# Altium schematic symbol library jlcpcb_2025_04_capacitors_extended_0402.schlib: 3594 symbols (part 16 of 20) (continued)
## GRM155R72A221KA01D
designator C?  Capacitance: 220pF  (hidden comment: *)
Capacitor, Ceramic (MLCC), 220pF, ±10%, 100V, X7R, ±10%, SMD 0402; Manufacturer: Murata Electronics; Manufacturer Part Number: GRM155R72A221KA01D; Package Size: 0402; JLCPCB Basic Part: No; JLCPCB Part Number: C117750; Supplier 1: LCSC; Category: Capacitors - MLCC; Supplier Part Number 1: C117750; Tolerance: ±10%; Voltage Rating: 100V; Temperature Coefficient: X7R; RoHS: Yes; ComponentLink1Description: Datasheet; ComponentLink1URL: https://wmsc.lcsc.com/wmsc/upload/file/pdf/v2/lcsc/2304140030_Murata-Electronics-GRM155R72A221KA01D_C117750.pdf; ComponentLink2Description: JLCPCB Part URL; ComponentLink2URL: https://jlcpcb.com/partdetail/C117750; ComponentLink3Description: LCSC Part URL; ComponentLink3URL: https://lcsc.com/product-detail/Multilayer-Ceramic-Capacitors-MLCC---SMD-SMT_Murata-Electronics-Murata-Electronics-GRM155R72A221KA01D_C117750.html
footprint CAP-0402 (0402 (1005M) Capacitor)
pins: 1, 2

## GRM155R72A332KA01D
designator C?  Capacitance: 3.3nF  (hidden comment: *)
Capacitor, Ceramic (MLCC), 3.3nF, ±10%, 100V, X7R, ±10%, SMD 0402; Manufacturer: Murata Electronics; Manufacturer Part Number: GRM155R72A332KA01D; Package Size: 0402; JLCPCB Basic Part: No; JLCPCB Part Number: C701289; Supplier 1: LCSC; Category: Capacitors - MLCC; Supplier Part Number 1: C701289; Tolerance: ±10%; Voltage Rating: 100V; Temperature Coefficient: X7R; RoHS: Yes; ComponentLink1Description: Datasheet; ComponentLink1URL: https://wmsc.lcsc.com/wmsc/upload/file/pdf/v2/lcsc/2304140030_Murata-Electronics-GRM155R72A332KA01D_C701289.pdf; ComponentLink2Description: JLCPCB Part URL; ComponentLink2URL: https://jlcpcb.com/partdetail/C701289; ComponentLink3Description: LCSC Part URL; ComponentLink3URL: https://lcsc.com/product-detail/Multilayer-Ceramic-Capacitors-MLCC---SMD-SMT_Murata-Electronics-Murata-Electronics-GRM155R72A332KA01D_C701289.html
footprint CAP-0402 (0402 (1005M) Capacitor)
pins: 1, 2

## GRM155R72A471KA01D
designator C?  Capacitance: 470pF  (hidden comment: *)
Capacitor, Ceramic (MLCC), 470pF, ±10%, 100V, X7R, ±10%, SMD 0402; Manufacturer: Murata Electronics; Manufacturer Part Number: GRM155R72A471KA01D; Package Size: 0402; JLCPCB Basic Part: No; JLCPCB Part Number: C437530; Supplier 1: LCSC; Category: Capacitors - MLCC; Supplier Part Number 1: C437530; Tolerance: ±10%; Voltage Rating: 100V; Temperature Coefficient: X7R; RoHS: Yes; ComponentLink1Description: Datasheet; ComponentLink1URL: https://wmsc.lcsc.com/wmsc/upload/file/pdf/v2/lcsc/2308111638_Murata-Electronics-GRM155R72A471KA01D_C437530.pdf; ComponentLink2Description: JLCPCB Part URL; ComponentLink2URL: https://jlcpcb.com/partdetail/C437530; ComponentLink3Description: LCSC Part URL; ComponentLink3URL: https://lcsc.com/product-detail/Multilayer-Ceramic-Capacitors-MLCC---SMD-SMT_Murata-Electronics-Murata-Electronics-GRM155R72A471KA01D_C437530.html
footprint CAP-0402 (0402 (1005M) Capacitor)
pins: 1, 2

## GRM155R72A472KA01D
designator C?  Capacitance: 4.7nF  (hidden comment: *)
Capacitor, Ceramic (MLCC), 4.7nF, ±10%, 100V, X7R, ±10%, SMD 0402; Manufacturer: Murata Electronics; Manufacturer Part Number: GRM155R72A472KA01D; Package Size: 0402; JLCPCB Basic Part: No; JLCPCB Part Number: C415704; Supplier 1: LCSC; Category: Capacitors - MLCC; Supplier Part Number 1: C415704; Tolerance: ±10%; Voltage Rating: 100V; Temperature Coefficient: X7R; RoHS: Yes; ComponentLink1Description: Datasheet; ComponentLink1URL: https://wmsc.lcsc.com/wmsc/upload/file/pdf/v2/lcsc/2304140030_Murata-Electronics-GRM155R72A472KA01D_C415704.pdf; ComponentLink2Description: JLCPCB Part URL; ComponentLink2URL: https://jlcpcb.com/partdetail/C415704; ComponentLink3Description: LCSC Part URL; ComponentLink3URL: https://lcsc.com/product-detail/Multilayer-Ceramic-Capacitors-MLCC---SMD-SMT_Murata-Electronics-Murata-Electronics-GRM155R72A472KA01D_C415704.html
footprint CAP-0402 (0402 (1005M) Capacitor)
pins: 1, 2

## GRM155R72A681KA01D
designator C?  Capacitance: 680pF  (hidden comment: *)
Capacitor, Ceramic (MLCC), 680pF, ±10%, 100V, X7R, ±10%, SMD 0402; Manufacturer: Murata Electronics; Manufacturer Part Number: GRM155R72A681KA01D; Package Size: 0402; JLCPCB Basic Part: No; JLCPCB Part Number: C464420; Supplier 1: LCSC; Category: Capacitors - MLCC; Supplier Part Number 1: C464420; Tolerance: ±10%; Voltage Rating: 100V; Temperature Coefficient: X7R; RoHS: Yes; ComponentLink1Description: Datasheet; ComponentLink1URL: https://wmsc.lcsc.com/wmsc/upload/file/pdf/v2/lcsc/2304140030_Murata-Electronics-GRM155R72A681KA01D_C464420.pdf; ComponentLink2Description: JLCPCB Part URL; ComponentLink2URL: https://jlcpcb.com/partdetail/C464420; ComponentLink3Description: LCSC Part URL; ComponentLink3URL: https://lcsc.com/product-detail/Multilayer-Ceramic-Capacitors-MLCC---SMD-SMT_Murata-Electronics-Murata-Electronics-GRM155R72A681KA01D_C464420.html
footprint CAP-0402 (0402 (1005M) Capacitor)
pins: 1, 2

## GRM155Z71A105KE01D
designator C?  Capacitance: 1uF  (hidden comment: *)
Capacitor, Ceramic (MLCC), 1uF, ±10%, 10V, X7R, ±10%, SMD 0402; Manufacturer: Murata Electronics; Manufacturer Part Number: GRM155Z71A105KE01D; Package Size: 0402; JLCPCB Basic Part: No; JLCPCB Part Number: C528974; Supplier 1: LCSC; Category: Capacitors - MLCC; Supplier Part Number 1: C528974; Tolerance: ±10%; Voltage Rating: 10V; Temperature Coefficient: X7R; RoHS: Yes; ComponentLink1Description: Datasheet; ComponentLink1URL: https://wmsc.lcsc.com/wmsc/upload/file/pdf/v2/lcsc/2005261833_Murata-Electronics-GRM155Z71A105KE01D_C528974.pdf; ComponentLink2Description: JLCPCB Part URL; ComponentLink2URL: https://jlcpcb.com/partdetail/C528974; ComponentLink3Description: LCSC Part URL; ComponentLink3URL: https://lcsc.com/product-detail/Multilayer-Ceramic-Capacitors-MLCC---SMD-SMT_Murata-Electronics-Murata-Electronics-GRM155Z71A105KE01D_C528974.html
footprint CAP-0402 (0402 (1005M) Capacitor)
pins: 1, 2

## GRM155Z71A225KE01D
designator C?  Capacitance: 2.2uF  (hidden comment: *)
Capacitor, Ceramic (MLCC), 2.2uF, 10V, X7R, SMD 0402; Manufacturer: Murata Electronics; Manufacturer Part Number: GRM155Z71A225KE01D; Package Size: 0402; JLCPCB Basic Part: No; JLCPCB Part Number: C2997286; Supplier 1: LCSC; Category: Capacitors - MLCC; Supplier Part Number 1: C2997286; Voltage Rating: 10V; Temperature Coefficient: X7R; RoHS: Yes; ComponentLink1Description: Datasheet; ComponentLink1URL: https://wmsc.lcsc.com/wmsc/upload/file/pdf/v2/lcsc/2208291730_Murata-Electronics-GRM155Z71A225KE01D_C2997286.pdf; ComponentLink2Description: JLCPCB Part URL; ComponentLink2URL: https://jlcpcb.com/partdetail/C2997286; ComponentLink3Description: LCSC Part URL; ComponentLink3URL: https://lcsc.com/product-detail/Multilayer-Ceramic-Capacitors-MLCC---SMD-SMT_Murata-Electronics-Murata-Electronics-GRM155Z71A225KE01D_C2997286.html
footprint CAP-0402 (0402 (1005M) Capacitor)
pins: 1, 2

## GRM155Z71A225KE44D
designator C?  Capacitance: 2.2uF  (hidden comment: *)
Capacitor, Ceramic (MLCC), 2.2uF, ±10%, 10V, X7R, ±10%, SMD 0402; Manufacturer: Murata Electronics; Manufacturer Part Number: GRM155Z71A225KE44D; Package Size: 0402; JLCPCB Basic Part: No; JLCPCB Part Number: C2999759; Supplier 1: LCSC; Category: Capacitors - MLCC; Supplier Part Number 1: C2999759; Tolerance: ±10%; Voltage Rating: 10V; Temperature Coefficient: X7R; RoHS: Yes; ComponentLink1Description: Datasheet; ComponentLink1URL: https://wmsc.lcsc.com/wmsc/upload/file/pdf/v2/lcsc/2208091530_Murata-Electronics-GRM155Z71A225KE44D_C2999759.pdf; ComponentLink2Description: JLCPCB Part URL; ComponentLink2URL: https://jlcpcb.com/partdetail/C2999759; ComponentLink3Description: LCSC Part URL; ComponentLink3URL: https://lcsc.com/product-detail/Multilayer-Ceramic-Capacitors-MLCC---SMD-SMT_Murata-Electronics-Murata-Electronics-GRM155Z71A225KE44D_C2999759.html
footprint CAP-0402 (0402 (1005M) Capacitor)
pins: 1, 2

## GRM158C80G226ME01D
designator C?  Capacitance: 22uF  (hidden comment: *)
Capacitor, Ceramic (MLCC), 22uF, ±20%, 4V, X6S, ±20%, SMD 0402; Manufacturer: Murata Electronics; Manufacturer Part Number: GRM158C80G226ME01D; Package Size: 0402; JLCPCB Basic Part: No; JLCPCB Part Number: C3854737; Supplier 1: LCSC; Category: Capacitors - MLCC; Supplier Part Number 1: C3854737; Tolerance: ±20%; Voltage Rating: 4V; Temperature Coefficient: X6S; RoHS: Yes; ComponentLink1Description: Datasheet; ComponentLink1URL: https://wmsc.lcsc.com/wmsc/upload/file/pdf/v2/lcsc/2308111748_Murata-Electronics-GRM158C80G226ME01D_C3854737.pdf; ComponentLink2Description: JLCPCB Part URL; ComponentLink2URL: https://jlcpcb.com/partdetail/C3854737; ComponentLink3Description: LCSC Part URL; ComponentLink3URL: https://lcsc.com/product-detail/Multilayer-Ceramic-Capacitors-MLCC---SMD-SMT_Murata-Electronics-Murata-Electronics-GRM158C80G226ME01D_C3854737.html
footprint CAP-0402 (0402 (1005M) Capacitor)
pins: 1, 2

## GRM158R61A226ME15D
designator C?  Capacitance: 22uF  (hidden comment: *)
Capacitor, Ceramic (MLCC), 22uF, ±20%, 10V, X5R, ±20%, SMD 0402; Manufacturer: Murata Electronics; Manufacturer Part Number: GRM158R61A226ME15D; Package Size: 0402; JLCPCB Basic Part: No; JLCPCB Part Number: C3845593; Supplier 1: LCSC; Category: Capacitors - MLCC; Supplier Part Number 1: C3845593; Tolerance: ±20%; Voltage Rating: 10V; Temperature Coefficient: X5R; RoHS: Yes; ComponentLink1Description: Datasheet; ComponentLink1URL: https://wmsc.lcsc.com/wmsc/upload/file/pdf/v2/lcsc/2308111745_Murata-Electronics-GRM158R61A226ME15D_C3845593.pdf; ComponentLink2Description: JLCPCB Part URL; ComponentLink2URL: https://jlcpcb.com/partdetail/C3845593; ComponentLink3Description: LCSC Part URL; ComponentLink3URL: https://lcsc.com/product-detail/Multilayer-Ceramic-Capacitors-MLCC---SMD-SMT_Murata-Electronics-Murata-Electronics-GRM158R61A226ME15D_C3845593.html
footprint CAP-0402 (0402 (1005M) Capacitor)
pins: 1, 2

## GRM1552C1H5R0CA01D
designator C?  Capacitance: 5pF  (hidden comment: *)
Capacitor, Ceramic (MLCC), 5pF, SMD 0402; Manufacturer: Murata Electronics; Manufacturer Part Number: GRM1552C1H5R0CA01D; Package Size: 0402; JLCPCB Basic Part: No; JLCPCB Part Number: C913619; Supplier 1: LCSC; Category: Capacitors - MLCC; Supplier Part Number 1: C913619; RoHS: Yes; ComponentLink1Description: Datasheet; ComponentLink1URL: https://wmsc.lcsc.com/wmsc/upload/file/pdf/v2/lcsc/2201131300_Murata-Electronics-GRM1552C1H5R0CA01D_C913619.pdf; ComponentLink2Description: JLCPCB Part URL; ComponentLink2URL: https://jlcpcb.com/partdetail/C913619; ComponentLink3Description: LCSC Part URL; ComponentLink3URL: https://lcsc.com/product-detail/Multilayer-Ceramic-Capacitors-MLCC---SMD-SMT_Murata-Electronics-Murata-Electronics-GRM1552C1H5R0CA01D_C913619.html
footprint CAP-0402 (0402 (1005M) Capacitor)
pins: 1, 2

## GRM1552C1H7R0DA01D
designator C?  Capacitance: 7pF  (hidden comment: *)
Capacitor, Ceramic (MLCC), 7pF, SMD 0402; Manufacturer: Murata Electronics; Manufacturer Part Number: GRM1552C1H7R0DA01D; Package Size: 0402; JLCPCB Basic Part: No; JLCPCB Part Number: C913617; Supplier 1: LCSC; Category: Capacitors - MLCC; Supplier Part Number 1: C913617; RoHS: Yes; ComponentLink1Description: Datasheet; ComponentLink1URL: https://wmsc.lcsc.com/wmsc/upload/file/pdf/v2/lcsc/2201131300_Murata-Electronics-GRM1552C1H7R0DA01D_C913617.pdf; ComponentLink2Description: JLCPCB Part URL; ComponentLink2URL: https://jlcpcb.com/partdetail/C913617; ComponentLink3Description: LCSC Part URL; ComponentLink3URL: https://lcsc.com/product-detail/Multilayer-Ceramic-Capacitors-MLCC---SMD-SMT_Murata-Electronics-Murata-Electronics-GRM1552C1H7R0DA01D_C913617.html
footprint CAP-0402 (0402 (1005M) Capacitor)
pins: 1, 2

## GRM1552C1H8R0DA01D
designator C?  Capacitance: 8pF  (hidden comment: *)
Capacitor, Ceramic (MLCC), 8pF, SMD 0402; Manufacturer: Murata Electronics; Manufacturer Part Number: GRM1552C1H8R0DA01D; Package Size: 0402; JLCPCB Basic Part: No; JLCPCB Part Number: C913616; Supplier 1: LCSC; Category: Capacitors - MLCC; Supplier Part Number 1: C913616; RoHS: Yes; ComponentLink1Description: Datasheet; ComponentLink1URL: https://wmsc.lcsc.com/wmsc/upload/file/pdf/v2/lcsc/2201131300_Murata-Electronics-GRM1552C1H8R0DA01D_C913616.pdf; ComponentLink2Description: JLCPCB Part URL; ComponentLink2URL: https://jlcpcb.com/partdetail/C913616; ComponentLink3Description: LCSC Part URL; ComponentLink3URL: https://lcsc.com/product-detail/Multilayer-Ceramic-Capacitors-MLCC---SMD-SMT_Murata-Electronics-Murata-Electronics-GRM1552C1H8R0DA01D_C913616.html
footprint CAP-0402 (0402 (1005M) Capacitor)
pins: 1, 2

## GRM1552C1H100GA01D
designator C?  Capacitance: 10pF  (hidden comment: *)
Capacitor, Ceramic (MLCC), 10pF, ±2%, 50V, CH, ±2%, SMD 0402; Manufacturer: Murata Electronics; Manufacturer Part Number: GRM1552C1H100GA01D; Package Size: 0402; JLCPCB Basic Part: No; JLCPCB Part Number: C161495; Supplier 1: LCSC; Category: Capacitors - MLCC; Supplier Part Number 1: C161495; Tolerance: ±2%; Voltage Rating: 50V; Temperature Coefficient: CH; RoHS: Yes; ComponentLink1Description: Datasheet; ComponentLink1URL: https://wmsc.lcsc.com/wmsc/upload/file/pdf/v2/lcsc/2111241030_Murata-Electronics-GRM1552C1H100GA01D_C161495.pdf; ComponentLink2Description: JLCPCB Part URL; ComponentLink2URL: https://jlcpcb.com/partdetail/C161495; ComponentLink3Description: LCSC Part URL; ComponentLink3URL: https://lcsc.com/product-detail/Multilayer-Ceramic-Capacitors-MLCC---SMD-SMT_Murata-Electronics-Murata-Electronics-GRM1552C1H100GA01D_C161495.html
footprint CAP-0402 (0402 (1005M) Capacitor)
pins: 1, 2

## GRM1552C1H100JA01D
designator C?  Capacitance: 10pF  (hidden comment: *)
Capacitor, Ceramic (MLCC), 10pF, ±5%, 50V, CH, ±5%, SMD 0402; Manufacturer: Murata Electronics; Manufacturer Part Number: GRM1552C1H100JA01D; Package Size: 0402; JLCPCB Basic Part: No; JLCPCB Part Number: C161496; Supplier 1: LCSC; Category: Capacitors - MLCC; Supplier Part Number 1: C161496; Tolerance: ±5%; Voltage Rating: 50V; Temperature Coefficient: CH; RoHS: Yes; ComponentLink1Description: Datasheet; ComponentLink1URL: https://wmsc.lcsc.com/wmsc/upload/file/pdf/v2/lcsc/1912111437_Murata-Electronics-GRM1552C1H100JA01D_C161496.pdf; ComponentLink2Description: JLCPCB Part URL; ComponentLink2URL: https://jlcpcb.com/partdetail/C161496; ComponentLink3Description: LCSC Part URL; ComponentLink3URL: https://lcsc.com/product-detail/Multilayer-Ceramic-Capacitors-MLCC---SMD-SMT_Murata-Electronics-Murata-Electronics-GRM1552C1H100JA01D_C161496.html
footprint CAP-0402 (0402 (1005M) Capacitor)
pins: 1, 2

## GRM1552C1H102JA01D
designator C?  Capacitance: 1nF  (hidden comment: *)
Capacitor, Ceramic (MLCC), 1nF, ±5%, 50V, CH, ±5%, SMD 0402; Manufacturer: Murata Electronics; Manufacturer Part Number: GRM1552C1H102JA01D; Package Size: 0402; JLCPCB Basic Part: No; JLCPCB Part Number: C182389; Supplier 1: LCSC; Category: Capacitors - MLCC; Supplier Part Number 1: C182389; Tolerance: ±5%; Voltage Rating: 50V; Temperature Coefficient: CH; RoHS: Yes; ComponentLink1Description: Datasheet; ComponentLink1URL: https://wmsc.lcsc.com/wmsc/upload/file/pdf/v2/lcsc/2304140030_Murata-Electronics-GRM1552C1H102JA01D_C182389.pdf; ComponentLink2Description: JLCPCB Part URL; ComponentLink2URL: https://jlcpcb.com/partdetail/C182389; ComponentLink3Description: LCSC Part URL; ComponentLink3URL: https://lcsc.com/product-detail/Multilayer-Ceramic-Capacitors-MLCC---SMD-SMT_Murata-Electronics-Murata-Electronics-GRM1552C1H102JA01D_C182389.html
footprint CAP-0402 (0402 (1005M) Capacitor)
pins: 1, 2

## GRM1552C1H120GA01D
designator C?  Capacitance: 12pF  (hidden comment: *)
Capacitor, Ceramic (MLCC), 12pF, ±2%, ±2%, SMD 0402; Manufacturer: Murata Electronics; Manufacturer Part Number: GRM1552C1H120GA01D; Package Size: 0402; JLCPCB Basic Part: No; JLCPCB Part Number: C913557; Supplier 1: LCSC; Category: Capacitors - MLCC; Supplier Part Number 1: C913557; Tolerance: ±2%; RoHS: Yes; ComponentLink1Description: Datasheet; ComponentLink1URL: https://wmsc.lcsc.com/wmsc/upload/file/pdf/v2/lcsc/2201131300_Murata-Electronics-GRM1552C1H120GA01D_C913557.pdf; ComponentLink2Description: JLCPCB Part URL; ComponentLink2URL: https://jlcpcb.com/partdetail/C913557; ComponentLink3Description: LCSC Part URL; ComponentLink3URL: https://lcsc.com/product-detail/Multilayer-Ceramic-Capacitors-MLCC---SMD-SMT_Murata-Electronics-Murata-Electronics-GRM1552C1H120GA01D_C913557.html
footprint CAP-0402 (0402 (1005M) Capacitor)
pins: 1, 2

## GRM1552C1H120JA01D
designator C?  Capacitance: 12pF  (hidden comment: *)
Capacitor, Ceramic (MLCC), 12pF, 50V, CH, SMD 0402; Manufacturer: Murata Electronics; Manufacturer Part Number: GRM1552C1H120JA01D; Package Size: 0402; JLCPCB Basic Part: No; JLCPCB Part Number: C2941919; Supplier 1: LCSC; Category: Capacitors - MLCC; Supplier Part Number 1: C2941919; Voltage Rating: 50V; Temperature Coefficient: CH; RoHS: Yes; ComponentLink1Description: Datasheet; ComponentLink1URL: https://wmsc.lcsc.com/wmsc/upload/file/pdf/v2/lcsc/2201211500_Murata-Electronics-GRM1552C1H120JA01D_C2941919.pdf; ComponentLink2Description: JLCPCB Part URL; ComponentLink2URL: https://jlcpcb.com/partdetail/C2941919; ComponentLink3Description: LCSC Part URL; ComponentLink3URL: https://lcsc.com/product-detail/Multilayer-Ceramic-Capacitors-MLCC---SMD-SMT_Murata-Electronics-Murata-Electronics-GRM1552C1H120JA01D_C2941919.html
footprint CAP-0402 (0402 (1005M) Capacitor)
pins: 1, 2

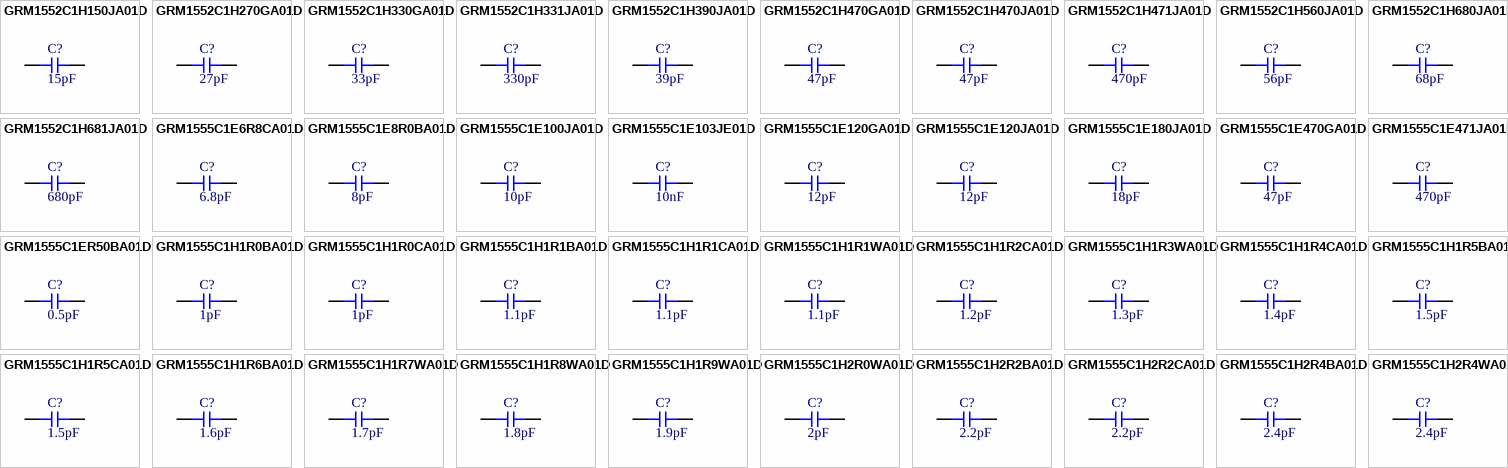
[diagram p71: symbols GRM1552C1H150JA01D to GRM1555C1H2R4WA01D]

## GRM1552C1H150JA01D
designator C?  Capacitance: 15pF  (hidden comment: *)
Capacitor, Ceramic (MLCC), 15pF, ±5%, 50V, CH, ±5%, SMD 0402; Manufacturer: Murata Electronics; Manufacturer Part Number: GRM1552C1H150JA01D; Package Size: 0402; JLCPCB Basic Part: No; JLCPCB Part Number: C471405; Supplier 1: LCSC; Category: Capacitors - MLCC; Supplier Part Number 1: C471405; Tolerance: ±5%; Voltage Rating: 50V; Temperature Coefficient: CH; RoHS: Yes; ComponentLink1Description: Datasheet; ComponentLink1URL: https://wmsc.lcsc.com/wmsc/upload/file/pdf/v2/lcsc/2308111810_Murata-Electronics-GRM1552C1H150JA01D_C471405.pdf; ComponentLink2Description: JLCPCB Part URL; ComponentLink2URL: https://jlcpcb.com/partdetail/C471405; ComponentLink3Description: LCSC Part URL; ComponentLink3URL: https://lcsc.com/product-detail/Multilayer-Ceramic-Capacitors-MLCC---SMD-SMT_Murata-Electronics-Murata-Electronics-GRM1552C1H150JA01D_C471405.html
footprint CAP-0402 (0402 (1005M) Capacitor)
pins: 1, 2

## GRM1552C1H270GA01D
designator C?  Capacitance: 27pF  (hidden comment: *)
Capacitor, Ceramic (MLCC), 27pF, ±2%, ±2%, SMD 0402; Manufacturer: Murata Electronics; Manufacturer Part Number: GRM1552C1H270GA01D; Package Size: 0402; JLCPCB Basic Part: No; JLCPCB Part Number: C913607; Supplier 1: LCSC; Category: Capacitors - MLCC; Supplier Part Number 1: C913607; Tolerance: ±2%; RoHS: Yes; ComponentLink1Description: Datasheet; ComponentLink1URL: https://wmsc.lcsc.com/wmsc/upload/file/pdf/v2/lcsc/2201131300_Murata-Electronics-GRM1552C1H270GA01D_C913607.pdf; ComponentLink2Description: JLCPCB Part URL; ComponentLink2URL: https://jlcpcb.com/partdetail/C913607; ComponentLink3Description: LCSC Part URL; ComponentLink3URL: https://lcsc.com/product-detail/Multilayer-Ceramic-Capacitors-MLCC---SMD-SMT_Murata-Electronics-Murata-Electronics-GRM1552C1H270GA01D_C913607.html
footprint CAP-0402 (0402 (1005M) Capacitor)
pins: 1, 2

## GRM1552C1H330GA01D
designator C?  Capacitance: 33pF  (hidden comment: *)
Capacitor, Ceramic (MLCC), 33pF, ±2%, ±2%, SMD 0402; Manufacturer: Murata Electronics; Manufacturer Part Number: GRM1552C1H330GA01D; Package Size: 0402; JLCPCB Basic Part: No; JLCPCB Part Number: C913606; Supplier 1: LCSC; Category: Capacitors - MLCC; Supplier Part Number 1: C913606; Tolerance: ±2%; RoHS: Yes; ComponentLink1Description: Datasheet; ComponentLink1URL: https://wmsc.lcsc.com/wmsc/upload/file/pdf/v2/lcsc/2201131300_Murata-Electronics-GRM1552C1H330GA01D_C913606.pdf; ComponentLink2Description: JLCPCB Part URL; ComponentLink2URL: https://jlcpcb.com/partdetail/C913606; ComponentLink3Description: LCSC Part URL; ComponentLink3URL: https://lcsc.com/product-detail/Multilayer-Ceramic-Capacitors-MLCC---SMD-SMT_Murata-Electronics-Murata-Electronics-GRM1552C1H330GA01D_C913606.html
footprint CAP-0402 (0402 (1005M) Capacitor)
pins: 1, 2

## GRM1552C1H331JA01D
designator C?  Capacitance: 330pF  (hidden comment: *)
Capacitor, Ceramic (MLCC), 330pF, ±5%, 50V, CH, ±5%, SMD 0402; Manufacturer: Murata Electronics; Manufacturer Part Number: GRM1552C1H331JA01D; Package Size: 0402; JLCPCB Basic Part: No; JLCPCB Part Number: C471376; Supplier 1: LCSC; Category: Capacitors - MLCC; Supplier Part Number 1: C471376; Tolerance: ±5%; Voltage Rating: 50V; Temperature Coefficient: CH; RoHS: Yes; ComponentLink1Description: Datasheet; ComponentLink1URL: https://wmsc.lcsc.com/wmsc/upload/file/pdf/v2/lcsc/2308111810_Murata-Electronics-GRM1552C1H331JA01D_C471376.pdf; ComponentLink2Description: JLCPCB Part URL; ComponentLink2URL: https://jlcpcb.com/partdetail/C471376; ComponentLink3Description: LCSC Part URL; ComponentLink3URL: https://lcsc.com/product-detail/Multilayer-Ceramic-Capacitors-MLCC---SMD-SMT_Murata-Electronics-Murata-Electronics-GRM1552C1H331JA01D_C471376.html
footprint CAP-0402 (0402 (1005M) Capacitor)
pins: 1, 2

## GRM1552C1H390JA01D
designator C?  Capacitance: 39pF  (hidden comment: *)
Capacitor, Ceramic (MLCC), 39pF, ±5%, ±5%, SMD 0402; Manufacturer: Murata Electronics; Manufacturer Part Number: GRM1552C1H390JA01D; Package Size: 0402; JLCPCB Basic Part: No; JLCPCB Part Number: C521079; Supplier 1: LCSC; Category: Capacitors - MLCC; Supplier Part Number 1: C521079; Tolerance: ±5%; RoHS: Yes; ComponentLink1Description: Datasheet; ComponentLink1URL: https://wmsc.lcsc.com/wmsc/upload/file/pdf/v2/lcsc/2009181909_Murata-Electronics-GRM1552C1H390JA01D_C521079.pdf; ComponentLink2Description: JLCPCB Part URL; ComponentLink2URL: https://jlcpcb.com/partdetail/C521079; ComponentLink3Description: LCSC Part URL; ComponentLink3URL: https://lcsc.com/product-detail/Multilayer-Ceramic-Capacitors-MLCC---SMD-SMT_Murata-Electronics-Murata-Electronics-GRM1552C1H390JA01D_C521079.html
footprint CAP-0402 (0402 (1005M) Capacitor)
pins: 1, 2

## GRM1552C1H470GA01D
designator C?  Capacitance: 47pF  (hidden comment: *)
Capacitor, Ceramic (MLCC), 47pF, ±2%, ±2%, SMD 0402; Manufacturer: Murata Electronics; Manufacturer Part Number: GRM1552C1H470GA01D; Package Size: 0402; JLCPCB Basic Part: No; JLCPCB Part Number: C913604; Supplier 1: LCSC; Category: Capacitors - MLCC; Supplier Part Number 1: C913604; Tolerance: ±2%; RoHS: Yes; ComponentLink1Description: Datasheet; ComponentLink1URL: https://wmsc.lcsc.com/wmsc/upload/file/pdf/v2/lcsc/2201131300_Murata-Electronics-GRM1552C1H470GA01D_C913604.pdf; ComponentLink2Description: JLCPCB Part URL; ComponentLink2URL: https://jlcpcb.com/partdetail/C913604; ComponentLink3Description: LCSC Part URL; ComponentLink3URL: https://lcsc.com/product-detail/Multilayer-Ceramic-Capacitors-MLCC---SMD-SMT_Murata-Electronics-Murata-Electronics-GRM1552C1H470GA01D_C913604.html
footprint CAP-0402 (0402 (1005M) Capacitor)
pins: 1, 2

## GRM1552C1H470JA01D
designator C?  Capacitance: 47pF  (hidden comment: *)
Capacitor, Ceramic (MLCC), 47pF, ±5%, 50V, CH, ±5%, SMD 0402; Manufacturer: Murata Electronics; Manufacturer Part Number: GRM1552C1H470JA01D; Package Size: 0402; JLCPCB Basic Part: No; JLCPCB Part Number: C161501; Supplier 1: LCSC; Category: Capacitors - MLCC; Supplier Part Number 1: C161501; Tolerance: ±5%; Voltage Rating: 50V; Temperature Coefficient: CH; RoHS: Yes; ComponentLink1Description: Datasheet; ComponentLink1URL: https://wmsc.lcsc.com/wmsc/upload/file/pdf/v2/lcsc/1912111437_Murata-Electronics-GRM1552C1H470JA01D_C161501.pdf; ComponentLink2Description: JLCPCB Part URL; ComponentLink2URL: https://jlcpcb.com/partdetail/C161501; ComponentLink3Description: LCSC Part URL; ComponentLink3URL: https://lcsc.com/product-detail/Multilayer-Ceramic-Capacitors-MLCC---SMD-SMT_Murata-Electronics-Murata-Electronics-GRM1552C1H470JA01D_C161501.html
footprint CAP-0402 (0402 (1005M) Capacitor)
pins: 1, 2

## GRM1552C1H471JA01D
designator C?  Capacitance: 470pF  (hidden comment: *)
Capacitor, Ceramic (MLCC), 470pF, ±5%, ±5%, SMD 0402; Manufacturer: Murata Electronics; Manufacturer Part Number: GRM1552C1H471JA01D; Package Size: 0402; JLCPCB Basic Part: No; JLCPCB Part Number: C913668; Supplier 1: LCSC; Category: Capacitors - MLCC; Supplier Part Number 1: C913668; Tolerance: ±5%; RoHS: Yes; ComponentLink1Description: Datasheet; ComponentLink1URL: https://wmsc.lcsc.com/wmsc/upload/file/pdf/v2/lcsc/2201242100_Murata-Electronics-GRM1552C1H471JA01D_C913668.pdf; ComponentLink2Description: JLCPCB Part URL; ComponentLink2URL: https://jlcpcb.com/partdetail/C913668; ComponentLink3Description: LCSC Part URL; ComponentLink3URL: https://lcsc.com/product-detail/Multilayer-Ceramic-Capacitors-MLCC---SMD-SMT_Murata-Electronics-Murata-Electronics-GRM1552C1H471JA01D_C913668.html
footprint CAP-0402 (0402 (1005M) Capacitor)
pins: 1, 2

## GRM1552C1H560JA01D
designator C?  Capacitance: 56pF  (hidden comment: *)
Capacitor, Ceramic (MLCC), 56pF, ±5%, 50V, ±5%, SMD 0402; Manufacturer: Murata Electronics; Manufacturer Part Number: GRM1552C1H560JA01D; Package Size: 0402; JLCPCB Basic Part: No; JLCPCB Part Number: C576441; Supplier 1: LCSC; Category: Capacitors - MLCC; Supplier Part Number 1: C576441; Tolerance: ±5%; Voltage Rating: 50V; RoHS: Yes; ComponentLink1Description: Datasheet; ComponentLink1URL: https://wmsc.lcsc.com/wmsc/upload/file/pdf/v2/lcsc/2112211830_Murata-Electronics-GRM1552C1H560JA01D_C576441.pdf; ComponentLink2Description: JLCPCB Part URL; ComponentLink2URL: https://jlcpcb.com/partdetail/C576441; ComponentLink3Description: LCSC Part URL; ComponentLink3URL: https://lcsc.com/product-detail/Multilayer-Ceramic-Capacitors-MLCC---SMD-SMT_Murata-Electronics-Murata-Electronics-GRM1552C1H560JA01D_C576441.html
footprint CAP-0402 (0402 (1005M) Capacitor)
pins: 1, 2

## GRM1552C1H680JA01D
designator C?  Capacitance: 68pF  (hidden comment: *)
Capacitor, Ceramic (MLCC), 68pF, ±5%, ±5%, SMD 0402; Manufacturer: Murata Electronics; Manufacturer Part Number: GRM1552C1H680JA01D; Package Size: 0402; JLCPCB Basic Part: No; JLCPCB Part Number: C913618; Supplier 1: LCSC; Category: Capacitors - MLCC; Supplier Part Number 1: C913618; Tolerance: ±5%; RoHS: Yes; ComponentLink1Description: Datasheet; ComponentLink1URL: https://wmsc.lcsc.com/wmsc/upload/file/pdf/v2/lcsc/2201131300_Murata-Electronics-GRM1552C1H680JA01D_C913618.pdf; ComponentLink2Description: JLCPCB Part URL; ComponentLink2URL: https://jlcpcb.com/partdetail/C913618; ComponentLink3Description: LCSC Part URL; ComponentLink3URL: https://lcsc.com/product-detail/Multilayer-Ceramic-Capacitors-MLCC---SMD-SMT_Murata-Electronics-Murata-Electronics-GRM1552C1H680JA01D_C913618.html
footprint CAP-0402 (0402 (1005M) Capacitor)
pins: 1, 2

## GRM1552C1H681JA01D
designator C?  Capacitance: 680pF  (hidden comment: *)
Capacitor, Ceramic (MLCC), 680pF, ±5%, 50V, CH, ±5%, SMD 0402; Manufacturer: Murata Electronics; Manufacturer Part Number: GRM1552C1H681JA01D; Package Size: 0402; JLCPCB Basic Part: No; JLCPCB Part Number: C471374; Supplier 1: LCSC; Category: Capacitors - MLCC; Supplier Part Number 1: C471374; Tolerance: ±5%; Voltage Rating: 50V; Temperature Coefficient: CH; RoHS: Yes; ComponentLink1Description: Datasheet; ComponentLink1URL: https://wmsc.lcsc.com/wmsc/upload/file/pdf/v2/lcsc/2308111810_Murata-Electronics-GRM1552C1H681JA01D_C471374.pdf; ComponentLink2Description: JLCPCB Part URL; ComponentLink2URL: https://jlcpcb.com/partdetail/C471374; ComponentLink3Description: LCSC Part URL; ComponentLink3URL: https://lcsc.com/product-detail/Multilayer-Ceramic-Capacitors-MLCC---SMD-SMT_Murata-Electronics-Murata-Electronics-GRM1552C1H681JA01D_C471374.html
footprint CAP-0402 (0402 (1005M) Capacitor)
pins: 1, 2

## GRM1555C1E6R8CA01D
designator C?  Capacitance: 6.8pF  (hidden comment: *)
Capacitor, Ceramic (MLCC), 6.8pF, 25V, C0G, SMD 0402; Manufacturer: Murata Electronics; Manufacturer Part Number: GRM1555C1E6R8CA01D; Package Size: 0402; JLCPCB Basic Part: No; JLCPCB Part Number: C3877782; Supplier 1: LCSC; Category: Capacitors - MLCC; Supplier Part Number 1: C3877782; Voltage Rating: 25V; Temperature Coefficient: C0G; RoHS: Yes; ComponentLink1Description: Datasheet; ComponentLink1URL: https://wmsc.lcsc.com/wmsc/upload/file/pdf/v2/lcsc/2308111505_Murata-Electronics-GRM1555C1E6R8CA01D_C3877782.pdf; ComponentLink2Description: JLCPCB Part URL; ComponentLink2URL: https://jlcpcb.com/partdetail/C3877782; ComponentLink3Description: LCSC Part URL; ComponentLink3URL: https://lcsc.com/product-detail/Multilayer-Ceramic-Capacitors-MLCC---SMD-SMT_Murata-Electronics-Murata-Electronics-GRM1555C1E6R8CA01D_C3877782.html
footprint CAP-0402 (0402 (1005M) Capacitor)
pins: 1, 2

## GRM1555C1E8R0BA01D
designator C?  Capacitance: 8pF  (hidden comment: *)
Capacitor, Ceramic (MLCC), 8pF, 25V, C0G, SMD 0402; Manufacturer: Murata Electronics; Manufacturer Part Number: GRM1555C1E8R0BA01D; Package Size: 0402; JLCPCB Basic Part: No; JLCPCB Part Number: C237549; Supplier 1: LCSC; Category: Capacitors - MLCC; Supplier Part Number 1: C237549; Voltage Rating: 25V; Temperature Coefficient: C0G; RoHS: Yes; ComponentLink1Description: Datasheet; ComponentLink1URL: https://wmsc.lcsc.com/wmsc/upload/file/pdf/v2/lcsc/2304140030_Murata-Electronics-GRM1555C1E8R0BA01D_C237549.pdf; ComponentLink2Description: JLCPCB Part URL; ComponentLink2URL: https://jlcpcb.com/partdetail/C237549; ComponentLink3Description: LCSC Part URL; ComponentLink3URL: https://lcsc.com/product-detail/Multilayer-Ceramic-Capacitors-MLCC---SMD-SMT_Murata-Electronics-Murata-Electronics-GRM1555C1E8R0BA01D_C237549.html
footprint CAP-0402 (0402 (1005M) Capacitor)
pins: 1, 2

## GRM1555C1E100JA01D
designator C?  Capacitance: 10pF  (hidden comment: *)
Capacitor, Ceramic (MLCC), 10pF, ±5%, 25V, C0G, ±5%, SMD 0402; Manufacturer: Murata Electronics; Manufacturer Part Number: GRM1555C1E100JA01D; Package Size: 0402; JLCPCB Basic Part: No; JLCPCB Part Number: C161512; Supplier 1: LCSC; Category: Capacitors - MLCC; Supplier Part Number 1: C161512; Tolerance: ±5%; Voltage Rating: 25V; Temperature Coefficient: C0G; RoHS: Yes; ComponentLink1Description: Datasheet; ComponentLink1URL: https://wmsc.lcsc.com/wmsc/upload/file/pdf/v2/lcsc/2308111632_Murata-Electronics-GRM1555C1E100JA01D_C161512.pdf; ComponentLink2Description: JLCPCB Part URL; ComponentLink2URL: https://jlcpcb.com/partdetail/C161512; ComponentLink3Description: LCSC Part URL; ComponentLink3URL: https://lcsc.com/product-detail/Multilayer-Ceramic-Capacitors-MLCC---SMD-SMT_Murata-Electronics-Murata-Electronics-GRM1555C1E100JA01D_C161512.html
footprint CAP-0402 (0402 (1005M) Capacitor)
pins: 1, 2

## GRM1555C1E103JE01D
designator C?  Capacitance: 10nF  (hidden comment: *)
Capacitor, Ceramic (MLCC), 10nF, ±5%, 25V, C0G, ±5%, SMD 0402; Manufacturer: Murata Electronics; Manufacturer Part Number: GRM1555C1E103JE01D; Package Size: 0402; JLCPCB Basic Part: No; JLCPCB Part Number: C3855387; Supplier 1: LCSC; Category: Capacitors - MLCC; Supplier Part Number 1: C3855387; Tolerance: ±5%; Voltage Rating: 25V; Temperature Coefficient: C0G; RoHS: Yes; ComponentLink1Description: Datasheet; ComponentLink1URL: https://wmsc.lcsc.com/wmsc/upload/file/pdf/v2/lcsc/2401240350_Murata-Electronics-GRM1555C1E103JE01D_C3855387.pdf; ComponentLink2Description: JLCPCB Part URL; ComponentLink2URL: https://jlcpcb.com/partdetail/C3855387; ComponentLink3Description: LCSC Part URL; ComponentLink3URL: https://lcsc.com/product-detail/Multilayer-Ceramic-Capacitors-MLCC---SMD-SMT_Murata-Electronics-Murata-Electronics-GRM1555C1E103JE01D_C3855387.html
footprint CAP-0402 (0402 (1005M) Capacitor)
pins: 1, 2

## GRM1555C1E120GA01D
designator C?  Capacitance: 12pF  (hidden comment: *)
Capacitor, Ceramic (MLCC), 12pF, ±2%, 25V, null, ±2%, SMD 0402; Manufacturer: Murata Electronics; Manufacturer Part Number: GRM1555C1E120GA01D; Package Size: 0402; JLCPCB Basic Part: No; JLCPCB Part Number: C882545; Supplier 1: LCSC; Category: Capacitors - MLCC; Supplier Part Number 1: C882545; Tolerance: ±2%; Voltage Rating: 25V; Temperature Coefficient: null; RoHS: Yes; ComponentLink1Description: Datasheet; ComponentLink1URL: https://wmsc.lcsc.com/wmsc/upload/file/pdf/v2/lcsc/2201242130_Murata-Electronics-GRM1555C1E120GA01D_C882545.pdf; ComponentLink2Description: JLCPCB Part URL; ComponentLink2URL: https://jlcpcb.com/partdetail/C882545; ComponentLink3Description: LCSC Part URL; ComponentLink3URL: https://lcsc.com/product-detail/Multilayer-Ceramic-Capacitors-MLCC---SMD-SMT_Murata-Electronics-Murata-Electronics-GRM1555C1E120GA01D_C882545.html
footprint CAP-0402 (0402 (1005M) Capacitor)
pins: 1, 2

## GRM1555C1E120JA01D
designator C?  Capacitance: 12pF  (hidden comment: *)
Capacitor, Ceramic (MLCC), 12pF, ±5%, 25V, C0G, ±5%, SMD 0402; Manufacturer: Murata Electronics; Manufacturer Part Number: GRM1555C1E120JA01D; Package Size: 0402; JLCPCB Basic Part: No; JLCPCB Part Number: C161514; Supplier 1: LCSC; Category: Capacitors - MLCC; Supplier Part Number 1: C161514; Tolerance: ±5%; Voltage Rating: 25V; Temperature Coefficient: C0G; RoHS: Yes; ComponentLink1Description: Datasheet; ComponentLink1URL: https://wmsc.lcsc.com/wmsc/upload/file/pdf/v2/lcsc/1811081546_Murata-Electronics-GRM1555C1E120JA01D_C161514.pdf; ComponentLink2Description: JLCPCB Part URL; ComponentLink2URL: https://jlcpcb.com/partdetail/C161514; ComponentLink3Description: LCSC Part URL; ComponentLink3URL: https://lcsc.com/product-detail/Multilayer-Ceramic-Capacitors-MLCC---SMD-SMT_Murata-Electronics-Murata-Electronics-GRM1555C1E120JA01D_C161514.html
footprint CAP-0402 (0402 (1005M) Capacitor)
pins: 1, 2

## GRM1555C1E180JA01D
designator C?  Capacitance: 18pF  (hidden comment: *)
Capacitor, Ceramic (MLCC), 18pF, ±5%, 25V, C0G, ±5%, SMD 0402; Manufacturer: Murata Electronics; Manufacturer Part Number: GRM1555C1E180JA01D; Package Size: 0402; JLCPCB Basic Part: No; JLCPCB Part Number: C191096; Supplier 1: LCSC; Category: Capacitors - MLCC; Supplier Part Number 1: C191096; Tolerance: ±5%; Voltage Rating: 25V; Temperature Coefficient: C0G; RoHS: Yes; ComponentLink1Description: Datasheet; ComponentLink1URL: https://wmsc.lcsc.com/wmsc/upload/file/pdf/v2/lcsc/1811081525_Murata-Electronics-GRM1555C1E180JA01D_C191096.pdf; ComponentLink2Description: JLCPCB Part URL; ComponentLink2URL: https://jlcpcb.com/partdetail/C191096; ComponentLink3Description: LCSC Part URL; ComponentLink3URL: https://lcsc.com/product-detail/Multilayer-Ceramic-Capacitors-MLCC---SMD-SMT_Murata-Electronics-Murata-Electronics-GRM1555C1E180JA01D_C191096.html
footprint CAP-0402 (0402 (1005M) Capacitor)
pins: 1, 2

## GRM1555C1E470GA01D
designator C?  Capacitance: 47pF  (hidden comment: *)
Capacitor, Ceramic (MLCC), 47pF, ±2%, 25V, C0G, ±2%, SMD 0402; Manufacturer: Murata Electronics; Manufacturer Part Number: GRM1555C1E470GA01D; Package Size: 0402; JLCPCB Basic Part: No; JLCPCB Part Number: C437519; Supplier 1: LCSC; Category: Capacitors - MLCC; Supplier Part Number 1: C437519; Tolerance: ±2%; Voltage Rating: 25V; Temperature Coefficient: C0G; RoHS: Yes; ComponentLink1Description: Datasheet; ComponentLink1URL: https://wmsc.lcsc.com/wmsc/upload/file/pdf/v2/lcsc/2304140030_Murata-Electronics-GRM1555C1E470GA01D_C437519.pdf; ComponentLink2Description: JLCPCB Part URL; ComponentLink2URL: https://jlcpcb.com/partdetail/C437519; ComponentLink3Description: LCSC Part URL; ComponentLink3URL: https://lcsc.com/product-detail/Multilayer-Ceramic-Capacitors-MLCC---SMD-SMT_Murata-Electronics-Murata-Electronics-GRM1555C1E470GA01D_C437519.html
footprint CAP-0402 (0402 (1005M) Capacitor)
pins: 1, 2

## GRM1555C1E471JA01D
designator C?  Capacitance: 470pF  (hidden comment: *)
Capacitor, Ceramic (MLCC), 470pF, ±5%, 25V, null, ±5%, SMD 0402; Manufacturer: Murata Electronics; Manufacturer Part Number: GRM1555C1E471JA01D; Package Size: 0402; JLCPCB Basic Part: No; JLCPCB Part Number: C710840; Supplier 1: LCSC; Category: Capacitors - MLCC; Supplier Part Number 1: C710840; Tolerance: ±5%; Voltage Rating: 25V; Temperature Coefficient: null; RoHS: Yes; ComponentLink1Description: Datasheet; ComponentLink1URL: https://wmsc.lcsc.com/wmsc/upload/file/pdf/v2/lcsc/2304140030_Murata-Electronics-GRM1555C1E471JA01D_C710840.pdf; ComponentLink2Description: JLCPCB Part URL; ComponentLink2URL: https://jlcpcb.com/partdetail/C710840; ComponentLink3Description: LCSC Part URL; ComponentLink3URL: https://lcsc.com/product-detail/Multilayer-Ceramic-Capacitors-MLCC---SMD-SMT_Murata-Electronics-Murata-Electronics-GRM1555C1E471JA01D_C710840.html
footprint CAP-0402 (0402 (1005M) Capacitor)
pins: 1, 2

## GRM1555C1ER50BA01D
designator C?  Capacitance: 0.5pF  (hidden comment: *)
Capacitor, Ceramic (MLCC), 0.5pF, 25V, null, SMD 0402; Manufacturer: Murata Electronics; Manufacturer Part Number: GRM1555C1ER50BA01D; Package Size: 0402; JLCPCB Basic Part: No; JLCPCB Part Number: C521078; Supplier 1: LCSC; Category: Capacitors - MLCC; Supplier Part Number 1: C521078; Voltage Rating: 25V; Temperature Coefficient: null; RoHS: Yes; ComponentLink1Description: Datasheet; ComponentLink1URL: https://wmsc.lcsc.com/wmsc/upload/file/pdf/v2/lcsc/2009181909_Murata-Electronics-GRM1555C1ER50BA01D_C521078.pdf; ComponentLink2Description: JLCPCB Part URL; ComponentLink2URL: https://jlcpcb.com/partdetail/C521078; ComponentLink3Description: LCSC Part URL; ComponentLink3URL: https://lcsc.com/product-detail/Multilayer-Ceramic-Capacitors-MLCC---SMD-SMT_Murata-Electronics-Murata-Electronics-GRM1555C1ER50BA01D_C521078.html
footprint CAP-0402 (0402 (1005M) Capacitor)
pins: 1, 2

## GRM1555C1H1R0BA01D
designator C?  Capacitance: 1pF  (hidden comment: *)
Capacitor, Ceramic (MLCC), 1pF, 50V, C0G, SMD 0402; Manufacturer: Murata Electronics; Manufacturer Part Number: GRM1555C1H1R0BA01D; Package Size: 0402; JLCPCB Basic Part: No; JLCPCB Part Number: C76952; Supplier 1: LCSC; Category: Capacitors - MLCC; Supplier Part Number 1: C76952; Voltage Rating: 50V; Temperature Coefficient: C0G; RoHS: Yes; ComponentLink1Description: Datasheet; ComponentLink1URL: https://wmsc.lcsc.com/wmsc/upload/file/pdf/v2/lcsc/1810311715_Murata-Electronics-GRM1555C1H1R0BA01D_C76952.pdf; ComponentLink2Description: JLCPCB Part URL; ComponentLink2URL: https://jlcpcb.com/partdetail/C76952; ComponentLink3Description: LCSC Part URL; ComponentLink3URL: https://lcsc.com/product-detail/Multilayer-Ceramic-Capacitors-MLCC---SMD-SMT_Murata-Electronics-Murata-Electronics-GRM1555C1H1R0BA01D_C76952.html
footprint CAP-0402 (0402 (1005M) Capacitor)
pins: 1, 2

## GRM1555C1H1R0CA01D
designator C?  Capacitance: 1pF  (hidden comment: *)
Capacitor, Ceramic (MLCC), 1pF, 50V, C0G, SMD 0402; Manufacturer: Murata Electronics; Manufacturer Part Number: GRM1555C1H1R0CA01D; Package Size: 0402; JLCPCB Basic Part: No; JLCPCB Part Number: C76953; Supplier 1: LCSC; Category: Capacitors - MLCC; Supplier Part Number 1: C76953; Voltage Rating: 50V; Temperature Coefficient: C0G; RoHS: Yes; ComponentLink1Description: Datasheet; ComponentLink1URL: https://wmsc.lcsc.com/wmsc/upload/file/pdf/v2/lcsc/1811081611_Murata-Electronics-GRM1555C1H1R0CA01D_C76953.pdf; ComponentLink2Description: JLCPCB Part URL; ComponentLink2URL: https://jlcpcb.com/partdetail/C76953; ComponentLink3Description: LCSC Part URL; ComponentLink3URL: https://lcsc.com/product-detail/Multilayer-Ceramic-Capacitors-MLCC---SMD-SMT_Murata-Electronics-Murata-Electronics-GRM1555C1H1R0CA01D_C76953.html
footprint CAP-0402 (0402 (1005M) Capacitor)
pins: 1, 2

## GRM1555C1H1R1BA01D
designator C?  Capacitance: 1.1pF  (hidden comment: *)
Capacitor, Ceramic (MLCC), 1.1pF, 50V, C0G, SMD 0402; Manufacturer: Murata Electronics; Manufacturer Part Number: GRM1555C1H1R1BA01D; Package Size: 0402; JLCPCB Basic Part: No; JLCPCB Part Number: C88919; Supplier 1: LCSC; Category: Capacitors - MLCC; Supplier Part Number 1: C88919; Voltage Rating: 50V; Temperature Coefficient: C0G; RoHS: Yes; ComponentLink1Description: Datasheet; ComponentLink1URL: https://wmsc.lcsc.com/wmsc/upload/file/pdf/v2/lcsc/2304140030_Murata-Electronics-GRM1555C1H1R1BA01D_C88919.pdf; ComponentLink2Description: JLCPCB Part URL; ComponentLink2URL: https://jlcpcb.com/partdetail/C88919; ComponentLink3Description: LCSC Part URL; ComponentLink3URL: https://lcsc.com/product-detail/Multilayer-Ceramic-Capacitors-MLCC---SMD-SMT_Murata-Electronics-Murata-Electronics-GRM1555C1H1R1BA01D_C88919.html
footprint CAP-0402 (0402 (1005M) Capacitor)
pins: 1, 2

## GRM1555C1H1R1CA01D
designator C?  Capacitance: 1.1pF  (hidden comment: *)
Capacitor, Ceramic (MLCC), 1.1pF, null, C0G, SMD 0402; Manufacturer: Murata Electronics; Manufacturer Part Number: GRM1555C1H1R1CA01D; Package Size: 0402; JLCPCB Basic Part: No; JLCPCB Part Number: C88920; Supplier 1: LCSC; Category: Capacitors - MLCC; Supplier Part Number 1: C88920; Voltage Rating: null; Temperature Coefficient: C0G; RoHS: Yes; ComponentLink1Description: Datasheet; ComponentLink1URL: https://wmsc.lcsc.com/wmsc/upload/file/pdf/v2/lcsc/2304140030_Murata-Electronics-GRM1555C1H1R1CA01D_C88920.pdf; ComponentLink2Description: JLCPCB Part URL; ComponentLink2URL: https://jlcpcb.com/partdetail/C88920; ComponentLink3Description: LCSC Part URL; ComponentLink3URL: https://lcsc.com/product-detail/Multilayer-Ceramic-Capacitors-MLCC---SMD-SMT_Murata-Electronics-Murata-Electronics-GRM1555C1H1R1CA01D_C88920.html
footprint CAP-0402 (0402 (1005M) Capacitor)
pins: 1, 2

## GRM1555C1H1R1WA01D
designator C?  Capacitance: 1.1pF  (hidden comment: *)
Capacitor, Ceramic (MLCC), 1.1pF, 50V, null, SMD 0402; Manufacturer: Murata Electronics; Manufacturer Part Number: GRM1555C1H1R1WA01D; Package Size: 0402; JLCPCB Basic Part: No; JLCPCB Part Number: C161536; Supplier 1: LCSC; Category: Capacitors - MLCC; Supplier Part Number 1: C161536; Voltage Rating: 50V; Temperature Coefficient: null; RoHS: Yes; ComponentLink1Description: Datasheet; ComponentLink1URL: https://wmsc.lcsc.com/wmsc/upload/file/pdf/v2/lcsc/2304140030_Murata-Electronics-GRM1555C1H1R1WA01D_C161536.pdf; ComponentLink2Description: JLCPCB Part URL; ComponentLink2URL: https://jlcpcb.com/partdetail/C161536; ComponentLink3Description: LCSC Part URL; ComponentLink3URL: https://lcsc.com/product-detail/Multilayer-Ceramic-Capacitors-MLCC---SMD-SMT_Murata-Electronics-Murata-Electronics-GRM1555C1H1R1WA01D_C161536.html
footprint CAP-0402 (0402 (1005M) Capacitor)
pins: 1, 2

## GRM1555C1H1R2CA01D
designator C?  Capacitance: 1.2pF  (hidden comment: *)
Capacitor, Ceramic (MLCC), 1.2pF, 50V, C0G, SMD 0402; Manufacturer: Murata Electronics; Manufacturer Part Number: GRM1555C1H1R2CA01D; Package Size: 0402; JLCPCB Basic Part: No; JLCPCB Part Number: C76955; Supplier 1: LCSC; Category: Capacitors - MLCC; Supplier Part Number 1: C76955; Voltage Rating: 50V; Temperature Coefficient: C0G; RoHS: Yes; ComponentLink1Description: Datasheet; ComponentLink1URL: https://wmsc.lcsc.com/wmsc/upload/file/pdf/v2/lcsc/1811081611_Murata-Electronics-GRM1555C1H1R2CA01D_C76955.pdf; ComponentLink2Description: JLCPCB Part URL; ComponentLink2URL: https://jlcpcb.com/partdetail/C76955; ComponentLink3Description: LCSC Part URL; ComponentLink3URL: https://lcsc.com/product-detail/Multilayer-Ceramic-Capacitors-MLCC---SMD-SMT_Murata-Electronics-Murata-Electronics-GRM1555C1H1R2CA01D_C76955.html
footprint CAP-0402 (0402 (1005M) Capacitor)
pins: 1, 2

## GRM1555C1H1R3WA01D
designator C?  Capacitance: 1.3pF  (hidden comment: *)
Capacitor, Ceramic (MLCC), 1.3pF, 50V, SMD 0402; Manufacturer: Murata Electronics; Manufacturer Part Number: GRM1555C1H1R3WA01D; Package Size: 0402; JLCPCB Basic Part: No; JLCPCB Part Number: C471403; Supplier 1: LCSC; Category: Capacitors - MLCC; Supplier Part Number 1: C471403; Voltage Rating: 50V; RoHS: Yes; ComponentLink1Description: Datasheet; ComponentLink1URL: https://wmsc.lcsc.com/wmsc/upload/file/pdf/v2/lcsc/2001071134_Murata-Electronics-GRM1555C1H1R3WA01D_C471403.pdf; ComponentLink2Description: JLCPCB Part URL; ComponentLink2URL: https://jlcpcb.com/partdetail/C471403; ComponentLink3Description: LCSC Part URL; ComponentLink3URL: https://lcsc.com/product-detail/Multilayer-Ceramic-Capacitors-MLCC---SMD-SMT_Murata-Electronics-Murata-Electronics-GRM1555C1H1R3WA01D_C471403.html
footprint CAP-0402 (0402 (1005M) Capacitor)
pins: 1, 2

## GRM1555C1H1R4CA01D
designator C?  Capacitance: 1.4pF  (hidden comment: *)
Capacitor, Ceramic (MLCC), 1.4pF, 50V, C0G, SMD 0402; Manufacturer: Murata Electronics; Manufacturer Part Number: GRM1555C1H1R4CA01D; Package Size: 0402; JLCPCB Basic Part: No; JLCPCB Part Number: C161537; Supplier 1: LCSC; Category: Capacitors - MLCC; Supplier Part Number 1: C161537; Voltage Rating: 50V; Temperature Coefficient: C0G; RoHS: Yes; ComponentLink1Description: Datasheet; ComponentLink1URL: https://wmsc.lcsc.com/wmsc/upload/file/pdf/v2/lcsc/2304140030_Murata-Electronics-GRM1555C1H1R4CA01D_C161537.pdf; ComponentLink2Description: JLCPCB Part URL; ComponentLink2URL: https://jlcpcb.com/partdetail/C161537; ComponentLink3Description: LCSC Part URL; ComponentLink3URL: https://lcsc.com/product-detail/Multilayer-Ceramic-Capacitors-MLCC---SMD-SMT_Murata-Electronics-Murata-Electronics-GRM1555C1H1R4CA01D_C161537.html
footprint CAP-0402 (0402 (1005M) Capacitor)
pins: 1, 2
